# Altium footprint library cool_library.PcbLib: 1182 footprints (part 5 of 75)
Each footprint in its own frame and in the unit in brackets; x right, y up, seen from the top. Pads: shape width x height; smd on the part's side, far side on the other; paste and mask are expansions set on the pad; w line width, h text height; cw(c..) or ccw(c..) is an arc to the next point about the centre after c.
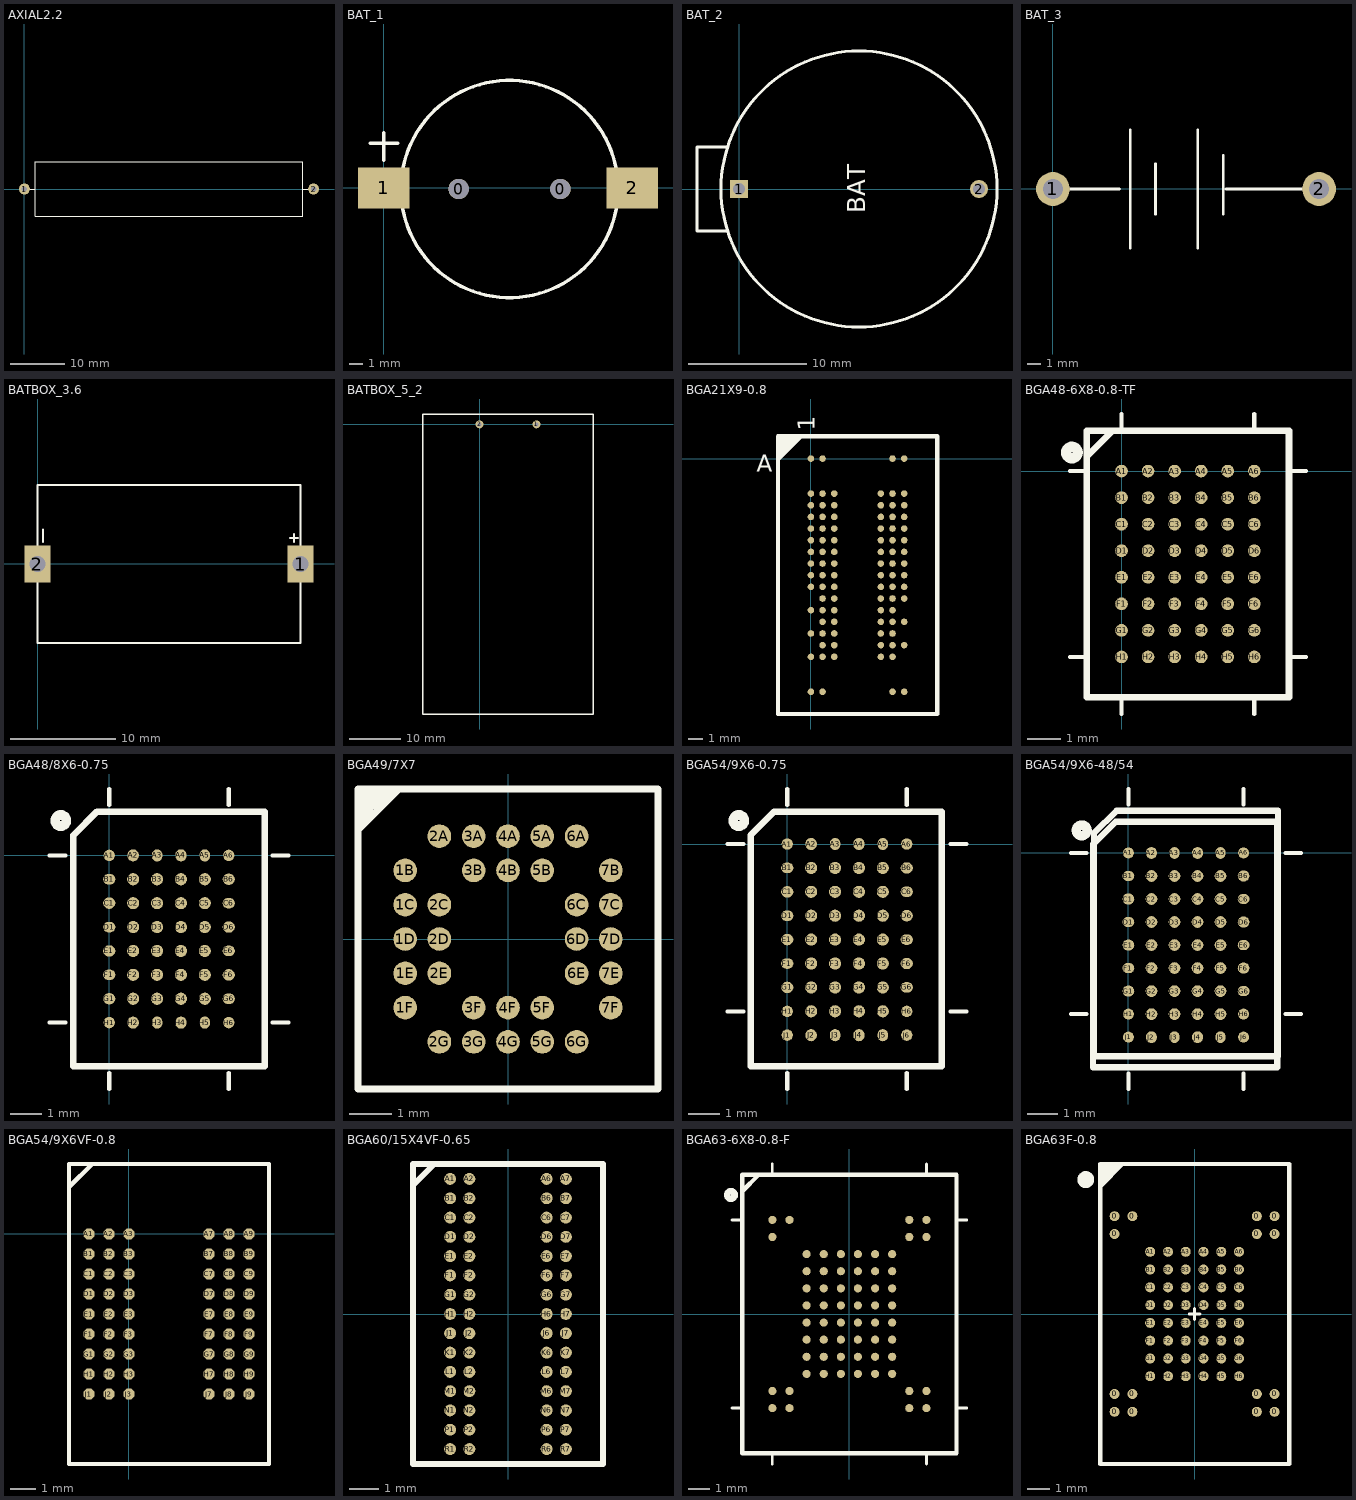
[diagram p4: the footprints below, top view; thin cyan lines are the x and y axes]

## AXIAL2.2 [mm]
pads (2):
  round 2 hole 1: 1(0,0) 2(53,0)
Top Overlay:
  lines w0.203: 0,0 2,0 ; 51,0 53,0 ; 2,-5 51,-5 51,5 2,5 2,-5

## BAT_1 [mm]
pads (4):
  round 1.5 hole 1.5: 0(5.505,-0.076) 0(13.005,-0.076)
  rect 3.81x3.048 smd: 1(0,0) 2(18.288,0)
Top Overlay:
  circle w0.254: c9.255,-0.076 r8
  lines w0.254: -1.016,3.302 1.016,3.302 ; 0,2.032 0,4.064

## BAT_2 [mil]
pads (2):
  rect 60x60 hole 40: 1(0,0)
  round 60 hole 40: 2(800,0)
Top Overlay:
  circle w10: c400,0 r460
  lines w10: -40,-140 -140,-140 -140,140 -40,140
  text "BAT" at 420,-80 h60

## BAT_3 [mm]
pads (2):
  round 2.54 hole 1.5: 1(0,0) 2(20,0)
Top Overlay:
  lines w0.203: 0.585,0 5,0 ; 5.81,-4.445 5.81,4.445 ; 7.715,-1.905 7.715,1.905 ; 10.89,-4.445 10.89,4.445 ; 12.795,-1.905 12.795,2.54 ; 13,0 19.365,0

## BATBOX_3.6 [mm]
pads (2):
  rect 2.5x3.5 hole 1.5: 1(24.975,-0.025) 2(-0.025,-0.025)
Top Overlay:
  lines w0.203: -0.025,-7.525 -0.025,-0.025 -0.025,7.475 ; -0.019,-7.525 24.975,-7.525 24.975,-0.025 24.975,7.475 -0.019,7.475 ; 0.508,2.083 0.508,3.226 ; 23.978,2.438 24.74,2.438 ; 24.359,2.057 24.359,2.819

## BATBOX_5_2 [mil] "两节5号电池插座"
pads (2):
  round 60 hole 30: 1(433.07,0) 2(0,0)
Top Overlay:
  lines w10: -433.07,-2204.72 -433.07,78.74 866.14,78.74 866.14,-2204.72 -433.07,-2204.72

## BGA21X9-0.8 [mm]
height 1.27
pads (92):
  round 0.45 smd mask-25.4: A1(0,0) A2(0.8,0) A8(5.6,0) A9(6.4,0) AA1(0,-16.004) AA2(0.8,-16.004) AA8(5.6,-16.004) AA9(6.4,-16.004) D1(0,-2.401) D2(0.8,-2.401) D3(1.6,-2.401) D7(4.8,-2.401) D8(5.6,-2.401) D9(6.4,-2.401) E1(0,-3.201) E2(0.8,-3.201) E3(1.6,-3.201) E7(4.8,-3.201) E8(5.6,-3.201) E9(6.4,-3.201) F1(0,-4.001) F2(0.8,-4.001) F3(1.6,-4.001) F7(4.8,-4.001) F8(5.6,-4.001) F9(6.4,-4.001) G1(0,-4.801) G2(0.8,-4.801) G3(1.6,-4.801) G7(4.8,-4.801) G8(5.6,-4.801) G9(6.4,-4.801) H1(0,-5.601) H2(0.8,-5.601) H3(1.6,-5.601) H7(4.8,-5.601) H8(5.6,-5.601) H9(6.4,-5.601) J1(0,-6.402) J2(0.8,-6.402) J3(1.6,-6.402) J7(4.8,-6.402) J8(5.6,-6.402) J9(6.4,-6.402) K1(0,-7.202) K2(0.8,-7.202) K3(1.6,-7.202) K7(4.8,-7.202) K8(5.6,-7.202) K9(6.4,-7.202) L1(0,-8.002) L2(0.8,-8.002) L3(1.6,-8.002) L7(4.8,-8.002) L8(5.6,-8.002) L9(6.4,-8.002) M1(0,-8.802) M2(0.8,-8.802) M3(1.6,-8.802) M7(4.8,-8.802) M8(5.6,-8.802) M9(6.4,-8.802) N2(0.8,-9.603) N3(1.6,-9.603) N7(4.8,-9.603) N8(5.6,-9.603) N9(6.4,-9.603) P1(0,-10.403) P2(0.8,-10.403) P3(1.6,-10.403) P7(4.8,-10.403) P8(5.6,-10.403) R2(0.8,-11.203) R3(1.6,-11.203) R7(4.8,-11.203) R8(5.6,-11.203) R9(6.4,-11.203) T1(0,-12.003) T2(0.8,-12.003) T3(1.6,-12.003) T7(4.8,-12.003) T8(5.6,-12.003) U2(0.8,-12.804) U3(1.6,-12.804) U7(4.8,-12.804) U8(5.6,-12.804) U9(6.4,-12.804) V1(0,-13.604) V2(0.8,-13.604) V3(1.6,-13.604) V7(4.8,-13.604) V8(5.6,-13.604)
Top Overlay:
  region: -2.261,-0.256 -0.483,1.522 -2.261,1.522
  lines w0.305: -2.261,-17.528 -2.261,1.522 8.661,1.522 8.661,-17.528 -2.261,-17.528
  text "A" at -3.708,-0.891 h1.16
  text "1" at 0.279,1.903 h1.16

## BGA48-6X8-0.8-TF [mil]
height 45
pads (48):
  round 15 smd: A1(0,0) A2(31.5,0) A3(62.99,0) A4(94.49,0) A5(125.98,0) A6(157.48,0) B1(0,-31.5) B2(31.5,-31.5) B3(62.99,-31.5) B4(94.49,-31.5) B5(125.98,-31.5) B6(157.48,-31.5) C1(0,-62.99) C2(31.5,-62.99) C3(62.99,-62.99) C4(94.49,-62.99) C5(125.98,-62.99) C6(157.48,-62.99) D1(0,-94.49) D2(31.5,-94.49) D3(62.99,-94.49) D4(94.49,-94.49) D5(125.98,-94.49) D6(157.48,-94.49) E1(0,-125.98) E2(31.5,-125.98) E3(62.99,-125.98) E4(94.49,-125.98) E5(125.98,-125.98) E6(157.48,-125.98) F1(0,-157.48) F2(31.5,-157.48) F3(62.99,-157.48) F4(94.49,-157.48) F5(125.98,-157.48) F6(157.48,-157.48) G1(0,-188.98) G2(31.5,-188.98) G3(62.99,-188.98) G4(94.49,-188.98) G5(125.98,-188.98) G6(157.48,-188.98) H1(0,-220.47) H2(31.5,-220.47) H3(62.99,-220.47) H4(94.49,-220.47) H5(125.98,-220.47) H6(157.48,-220.47)
Top Overlay:
  circle w12: c-58.9,22 r6.9
  lines w5: -61.26,-220.47 -41.26,-220.47 ; -61.26,0 -41.26,0 ; 0,-288.24 0,-268.24 ; 0,47.76 0,67.76 ; 157.48,-288.24 157.48,-268.24 ; 157.48,47.76 157.48,67.76 ; 198.74,-220.47 218.74,-220.47 ; 198.74,0 218.74,0
  lines w8: -40.13,18.63 -11,47.76 ; -41.26,-268.24 -41.26,47.76 198.74,47.76 198.74,-268.24 -41.26,-268.24

## BGA48/8X6-0.75 [mil]
height 1574.8
pads (48):
  round 14 smd: A1(0,0) A6(147.64,0) H1(0,-206.69) H6(147.64,-206.69)
  oval 14x15 smd: A2(29.53,0) A4(88.58,0) H2(29.53,-206.69) H4(88.58,-206.69)
  oval 13x15 smd: A3(59.05,0) A5(118.11,0) H3(59.05,-206.69) H5(118.11,-206.69)
  oval 15x13 smd: B1(0,-29.53) C6(147.64,-59.05) D1(0,-88.58) E6(147.64,-118.11) F1(0,-147.64) G6(147.64,-177.17)
  round 15 smd: B2(29.53,-29.53) B3(59.06,-29.53) B4(88.58,-29.53) B5(118.11,-29.53) C2(29.53,-59.06) C3(59.06,-59.06) C4(88.58,-59.06) C5(118.11,-59.06) D2(29.53,-88.58) D3(59.06,-88.58) D4(88.58,-88.58) D5(118.11,-88.58) E2(29.53,-118.11) E3(59.06,-118.11) E4(88.58,-118.11) E5(118.11,-118.11) F2(29.53,-147.64) F3(59.06,-147.64) F4(88.58,-147.64) F5(118.11,-147.64) G2(29.53,-177.17) G3(59.06,-177.17) G4(88.58,-177.17) G5(118.11,-177.17)
  oval 15x14 smd: B6(147.64,-29.53) C1(0,-59.05) D6(147.64,-88.58) E1(0,-118.11) F6(147.64,-147.64) G1(0,-177.17)
Top Overlay:
  circle w12: c-59.9,43 r6.9
  lines w5: -74,-206.69 -54,-206.69 ; -74,0 -54,0 ; 0,-288.69 0,-268.69 ; 0,62 0,82 ; 147.64,-288.69 147.64,-268.69 ; 147.64,62 147.64,82 ; 201.64,-206.69 221.64,-206.69 ; 201.64,0 221.64,0
  lines w8: -44.29,-260.83 -44.29,25 -15.16,54.13 191.93,54.17 191.93,-260.83 -44.29,-260.83

## BGA49/7X7 [mm]
pads (32):
  round 0.55 smd: 1B(-2.4,1.6) 1C(-2.4,0.8) 1D(-2.4,0) 1E(-2.4,-0.8) 1F(-2.4,-1.6) 2A(-1.6,2.4) 2C(-1.6,0.8) 2D(-1.6,0) 2E(-1.6,-0.8) 2G(-1.6,-2.4) 3A(-0.8,2.4) 3B(-0.8,1.6) 3F(-0.8,-1.6) 3G(-0.8,-2.4) 4A(0,2.4) 4B(0,1.6) 4F(0,-1.6) 4G(0,-2.4) 5A(0.8,2.4) 5B(0.8,1.6) 5F(0.8,-1.6) 5G(0.8,-2.4) 6A(1.6,2.4) 6C(1.6,0.8) 6D(1.6,0) 6E(1.6,-0.8) 6G(1.6,-2.4) 7B(2.4,1.6) 7C(2.4,0.8) 7D(2.4,0) 7E(2.4,-0.8) 7F(2.4,-1.6)
Top Overlay:
  rectangle: -3.5,3.019 -3.021,3.5
  rectangle: -3.5,2.907 -3.133,3.019
  rectangle: -3.5,2.722 -3.318,2.896
  rectangle: -3.5,2.812 -3.228,2.921
  rectangle: -3.073,3.316 -2.724,3.5
  rectangle: -3.073,3.213 -2.827,3.316
  rectangle: -3.073,3.126 -2.914,3.213
  lines w0.152: -3.5,2.54 -2.54,3.5 ; -3.5,-3.5 -3.5,3.5 3.5,3.5 3.5,-3.5 -3.5,-3.5

## BGA54/9X6-0.75 [mil]
height 39.37
pads (54):
  round 14 smd: A1(0,0) A6(147.64,0) H1(0,-206.69) H6(147.64,-206.69) J1(0,-236.22) J6(147.64,-236.22)
  oval 14x15 smd: A2(29.53,0) A4(88.58,0) J2(29.53,-236.22) J4(88.58,-236.22)
  oval 13x15 smd: A3(59.05,0) A5(118.11,0) J3(59.06,-236.22) J5(118.11,-236.22)
  oval 15x13 smd: B1(0,-29.53) C6(147.64,-59.05) D1(0,-88.58) E6(147.64,-118.11) F1(0,-147.64) G6(147.64,-177.17)
  round 15 smd: B2(29.53,-29.53) B3(59.06,-29.53) B4(88.58,-29.53) B5(118.11,-29.53) C2(29.53,-59.06) C3(59.06,-59.06) C4(88.58,-59.06) C5(118.11,-59.06) D2(29.53,-88.58) D3(59.06,-88.58) D4(88.58,-88.58) D5(118.11,-88.58) E2(29.53,-118.11) E3(59.06,-118.11) E4(88.58,-118.11) E5(118.11,-118.11) F2(29.53,-147.64) F3(59.06,-147.64) F4(88.58,-147.64) F5(118.11,-147.64) G2(29.53,-177.17) G3(59.06,-177.17) G4(88.58,-177.17) G5(118.11,-177.17) H2(29.53,-206.69) H3(59.05,-206.69) H4(88.58,-206.69) H5(118.11,-206.69)
  oval 15x14 smd: B6(147.64,-29.53) C1(0,-59.05) D6(147.64,-88.58) E1(0,-118.11) F6(147.64,-147.64) G1(0,-177.17)
Top Overlay:
  circle w12: c-59.9,29 r6.9
  lines w5: -74,-206.69 -54,-206.69 ; -74,0 -54,0 ; 0,-302.69 0,-282.69 ; 0,48 0,68 ; 147.64,-302.69 147.64,-282.69 ; 147.64,48 147.64,68 ; 201.64,-206.69 221.64,-206.69 ; 201.64,0 221.64,0
  lines w8: -45.29,-274.83 190.93,-274.83 190.93,40.17 -16.16,40.13 -45.29,11 -45.29,-274.83

## BGA54/9X6-48/54 [mil]
pads (54):
  round 14 smd: A1(0,0) A6(147.64,0) H1(0,-206.69) H6(147.64,-206.69) J1(0,-236.22) J6(147.64,-236.22)
  oval 14x15 smd: A2(29.53,0) A4(88.58,0) J2(29.53,-236.22) J4(88.58,-236.22)
  oval 13x15 smd: A3(59.05,0) A5(118.11,0) J3(59.06,-236.22) J5(118.11,-236.22)
  oval 15x13 smd: B1(0,-29.53) C6(147.64,-59.05) D1(0,-88.58) E6(147.64,-118.11) F1(0,-147.64) G6(147.64,-177.17)
  round 15 smd: B2(29.53,-29.53) B3(59.06,-29.53) B4(88.58,-29.53) B5(118.11,-29.53) C2(29.53,-59.06) C3(59.06,-59.06) C4(88.58,-59.06) C5(118.11,-59.06) D2(29.53,-88.58) D3(59.06,-88.58) D4(88.58,-88.58) D5(118.11,-88.58) E2(29.53,-118.11) E3(59.06,-118.11) E4(88.58,-118.11) E5(118.11,-118.11) F2(29.53,-147.64) F3(59.06,-147.64) F4(88.58,-147.64) F5(118.11,-147.64) G2(29.53,-177.17) G3(59.06,-177.17) G4(88.58,-177.17) G5(118.11,-177.17) H2(29.53,-206.69) H3(59.05,-206.69) H4(88.58,-206.69) H5(118.11,-206.69)
  oval 15x14 smd: B6(147.64,-29.53) C1(0,-59.05) D6(147.64,-88.58) E1(0,-118.11) F6(147.64,-147.64) G1(0,-177.17)
Top Overlay:
  circle w12: c-59.9,29 r6.9
  lines w5: -74,-206.69 -54,-206.69 ; -74,0 -54,0 ; 0,-302.69 0,-282.69 ; 0,62 0,82 ; 147.64,-302.69 147.64,-282.69 ; 147.64,62 147.64,82 ; 201.64,-206.69 221.64,-206.69 ; 201.64,0 221.64,0
  lines w8: -45.29,-274.83 190.93,-274.83 190.93,40.17 -16.16,40.13 -45.29,11 -45.29,-274.83 ; -44.29,-260.83 -44.29,25 -15.16,54.13 191.93,54.13 191.93,-260.83 -44.29,-260.83

## BGA54/9X6VF-0.8 [mil]
height 39.37
pads (54):
  round 18 smd: A1(-62.99,0) A2(-31.5,0) A3(0,0) A7(125.98,0) A8(157.48,0) A9(188.98,0) B1(-62.99,-31.5) B2(-31.5,-31.5) B3(0,-31.5) B7(125.98,-31.5) B8(157.48,-31.5) B9(188.98,-31.5) C1(-62.99,-62.99) C2(-31.5,-62.99) C3(0,-62.99) C7(125.98,-62.99) C8(157.48,-62.99) C9(188.98,-62.99) D1(-62.99,-94.49) D2(-31.5,-94.49) D3(0,-94.49) D7(125.98,-94.49) D8(157.48,-94.49) D9(188.98,-94.49) E1(-62.99,-125.98) E2(-31.5,-125.98) E3(0,-125.98) E7(125.98,-125.98) E8(157.48,-125.98) E9(188.98,-125.98) F1(-62.99,-157.48) F2(-31.5,-157.48) F3(0,-157.48) F7(125.98,-157.48) F8(157.48,-157.48) F9(188.98,-157.48) G1(-62.99,-188.98) G2(-31.5,-188.98) G3(0,-188.98) G7(125.98,-188.98) G8(157.48,-188.98) G9(188.98,-188.98) H1(-62.99,-220.47) H2(-31.5,-220.47) H3(0,-220.47) H7(125.98,-220.47) H8(157.48,-220.47) H9(188.98,-220.47) J1(-62.99,-251.97) J2(-31.5,-251.97) J3(0,-251.97) J7(125.98,-251.97) J8(157.48,-251.97) J9(188.98,-251.97)
Top Overlay:
  lines w7: -94,74.24 -58,110.24 ; -94.49,-362.2 220.47,-362.2 220.47,110.24 -94.49,110.24 -94.49,-362.2

## BGA60/15X4VF-0.65 [mm]
pads (60):
  round 0.4 smd: A1(-1.95,4.55) A2(-1.3,4.55) A6(1.3,4.55) A7(1.95,4.55) B1(-1.95,3.9) B2(-1.3,3.9) B6(1.3,3.9) B7(1.95,3.9) C1(-1.95,3.25) C2(-1.3,3.25) C6(1.3,3.25) C7(1.95,3.25) D1(-1.95,2.6) D2(-1.3,2.6) D6(1.3,2.6) D7(1.95,2.6) E1(-1.95,1.95) E2(-1.3,1.95) E6(1.3,1.95) E7(1.95,1.95) F1(-1.95,1.3) F2(-1.3,1.3) F6(1.3,1.3) F7(1.95,1.3) G1(-1.95,0.65) G2(-1.3,0.65) G6(1.3,0.65) G7(1.95,0.65) H1(-1.95,0) H2(-1.3,0) H6(1.3,0) H7(1.95,0) J1(-1.95,-0.65) J2(-1.3,-0.65) J6(1.3,-0.65) J7(1.95,-0.65) K1(-1.95,-1.3) K2(-1.3,-1.3) K6(1.3,-1.3) K7(1.95,-1.3) L1(-1.95,-1.95) L2(-1.3,-1.95) L6(1.3,-1.95) L7(1.95,-1.95) M1(-1.95,-2.6) M2(-1.3,-2.6) M6(1.3,-2.6) M7(1.95,-2.6) N1(-1.95,-3.25) N2(-1.3,-3.25) N6(1.3,-3.25) N7(1.95,-3.25) P1(-1.95,-3.9) P2(-1.3,-3.9) P6(1.3,-3.9) P7(1.95,-3.9) R1(-1.95,-4.55) R2(-1.3,-4.55) R6(1.3,-4.55) R7(1.95,-4.55)
Top Overlay:
  lines w0.2: -3.2,-5.055 -3.2,5.055 3.2,5.055 3.2,-5.055 -3.2,-5.055
  lines w0.203: -3.2,4.343 -2.489,5.055

## BGA63-6X8-0.8-F [mm]
height 1.016
pads (63):
  round 0.381 smd: A1(-2,2.8) A2(-1.2,2.8) A3(-0.4,2.8) A4(0.4,2.8) A5(1.2,2.8) A6(2,2.8) B1(-2,2) B2(-1.2,2) B3(-0.4,2) B4(0.4,2) B5(1.2,2) B6(2,2) C1(-2,1.2) C2(-1.2,1.2) C3(-0.4,1.2) C4(0.4,1.2) C5(1.2,1.2) C6(2,1.2) D1(-2,0.4) D2(-1.2,0.4) D3(-0.4,0.4) D4(0.4,0.4) D5(1.2,0.4) D6(2,0.4) E1(-2,-0.4) E2(-1.2,-0.4) E3(-0.4,-0.4) E4(0.4,-0.4) E5(1.2,-0.4) E6(2,-0.4) F1(-2,-1.2) F2(-1.2,-1.2) F3(-0.4,-1.2) F4(0.4,-1.2) F5(1.2,-1.2) F6(2,-1.2) G1(-2,-2) G2(-1.2,-2) G3(-0.4,-2) G4(0.4,-2) G5(1.2,-2) G6(2,-2) H1(-2,-2.8) H2(-1.2,-2.8) H3(-0.4,-2.8) H4(0.4,-2.8) H5(1.2,-2.8) H6(2,-2.8) NC(-3.6,-4.4) NC(-3.6,-3.6) NC(-3.6,3.6) NC(-3.6,4.4) NC(-2.8,-4.4) NC(-2.8,-3.6) NC(-2.8,4.4) NC(2.8,-4.4) NC(2.8,-3.6) NC(2.8,3.6) NC(2.8,4.4) NC(3.6,-4.4) NC(3.6,-3.6) NC(3.6,3.6) NC(3.6,4.4)
Top Overlay:
  circle w0.305: c-5.535,5.563 r0.175
  lines w0.127: -5.486,-4.394 -4.978,-4.394 ; -5.486,4.394 -4.978,4.394 ; -3.607,-7.01 -3.607,-6.502 ; -3.607,6.502 -3.607,7.01 ; 3.607,-7.01 3.607,-6.502 ; 3.607,6.502 3.607,7.01 ; 4.978,-4.394 5.486,-4.394 ; 4.978,4.394 5.486,4.394
  lines w0.203: -4.982,5.762 -4.242,6.502 ; -5.004,-6.502 -5.004,6.502 5.004,6.502 5.004,-6.502 -5.004,-6.502

## BGA63F-0.8 [mm]
height 1.27
pads (63):
  round 0.45 smd: 0(-3.6,-3.6) 0(-3.6,3.6) 0(-3.6,-4.4) 0(-3.6,4.4) 0(-2.8,-3.6) 0(-2.8,-4.4) 0(-2.8,4.4) 0(2.8,3.6) 0(2.8,-4.4) 0(2.8,4.4) 0(2.8,-3.6) 0(3.6,-4.4) 0(3.6,4.4) 0(3.6,-3.6) 0(3.6,3.6) A1(-2,2.8) A2(-1.2,2.8) A3(-0.4,2.8) A4(0.4,2.8) A5(1.2,2.8) A6(2,2.8) B1(-2,2) B2(-1.2,2) B3(-0.4,2) B4(0.4,2) B5(1.2,2) B6(2,2) C1(-2,1.2) C2(-1.2,1.2) C3(-0.4,1.2) C4(0.4,1.2) C5(1.2,1.2) C6(2,1.2) D1(-2,0.4) D2(-1.2,0.4) D3(-0.4,0.4) D4(0.4,0.4) D5(1.2,0.4) D6(2,0.4) E1(-2,-0.4) E2(-1.2,-0.4) E3(-0.4,-0.4) E4(0.4,-0.4) E5(1.2,-0.4) E6(2,-0.4) F1(-2,-1.2) F2(-1.2,-1.2) F3(-0.4,-1.2) F4(0.4,-1.2) F5(1.2,-1.2) F6(2,-1.2) G1(-2,-2) G2(-1.2,-2) G3(-0.4,-2) G4(0.4,-2) G5(1.2,-2) G6(2,-2) H1(-2,-2.8) H2(-1.2,-2.8) H3(-0.4,-2.8) H4(0.4,-2.8) H5(1.2,-2.8) H6(2,-2.8)
Top Overlay:
  circle w0.508: c-4.9,6.046 r0.125
  region: -3.25,6.746 -4.25,5.746 -4.25,6.746
  lines w0.127: -0.241,0 0,0 ; 0,-0.241 0,0 ; 0,0.241 0,0 ; 0.241,0 0,0
  lines w0.2: -4.25,5.746 -3.25,6.746 ; -4.25,-6.75 -4.25,0 -4.25,6.75 4.25,6.75 4.25,0 4.25,-6.75 -4.25,-6.75